# Altium footprint library Transistor.PcbLib: 86 footprints (part 4 of 6)
Each footprint in its own frame and in the unit in brackets; x right, y up, seen from the top. Pads: shape width x height; smd on the part's side, far side on the other; paste and mask are expansions set on the pad; w line width, h text height; cw(c..) or ccw(c..) is an arc to the next point about the centre after c.
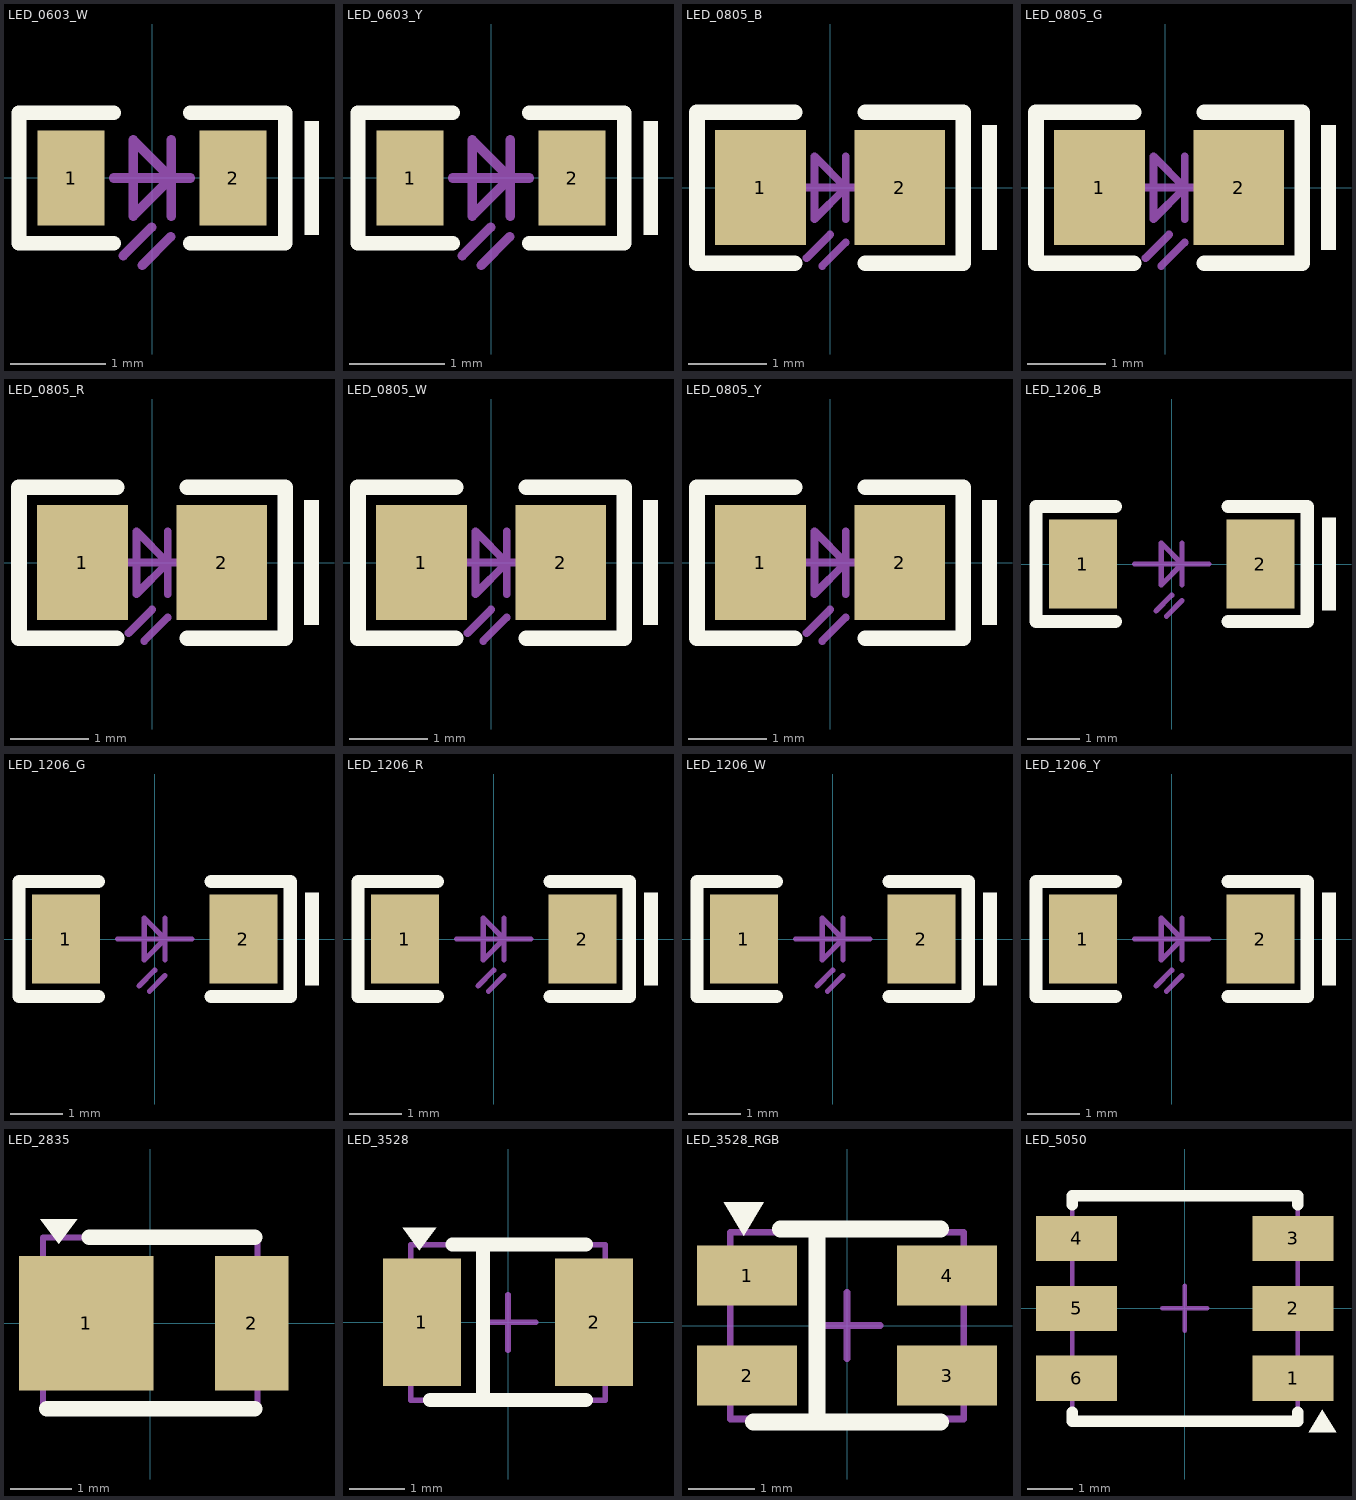
[diagram p3: the footprints below, top view; thin cyan lines are the x and y axes]

## LED_0603_W [mm]
pads (2):
  rect 0.7x1 smd: 1(-0.85,0) 2(0.85,0)
Top Overlay:
  region: 1.753,0.6 1.599,0.6 1.599,-0.6 1.753,-0.6
  lines w0.152: -0.4,-0.686 -1.397,-0.686 -1.397,0.686 -0.4,0.686 ; 0.4,-0.686 1.397,-0.686 1.397,0.686 0.4,0.686
Mechanical 13:
  lines w0.1: -0.4,0 0.4,0 ; -0.305,-0.817 -0.005,-0.517 ; -0.105,-0.917 0.195,-0.617 ; 0.2,-0.4 0.2,0.4 ; -0.2,-0.4 0.2,0 -0.2,0.4 -0.2,-0.4
3D body "15.STEP": height 0.61, standoff 0, extent -0.8,-0.381 0.8,0.421

## LED_0603_Y [mm]
pads (2):
  rect 0.7x1 smd: 1(-0.85,0) 2(0.85,0)
Top Overlay:
  region: 1.753,0.6 1.599,0.6 1.599,-0.6 1.753,-0.6
  lines w0.152: -0.4,-0.686 -1.397,-0.686 -1.397,0.686 -0.4,0.686 ; 0.4,-0.686 1.397,-0.686 1.397,0.686 0.4,0.686
Mechanical 13:
  lines w0.1: -0.4,0 0.4,0 ; -0.305,-0.817 -0.005,-0.517 ; -0.105,-0.917 0.195,-0.617 ; 0.2,-0.4 0.2,0.4 ; -0.2,-0.4 -0.2,0.4 0.2,0 -0.2,-0.4
3D body "14.STEP": height 0.61, standoff 0, extent -0.8,-0.402 0.8,0.406

## LED_0805_B [mm]
pads (2):
  rect 1.16x1.47 smd: 1(-0.89,0) 2(0.89,0)
Top Overlay:
  region: 2.134,0.8 1.945,0.8 1.945,-0.8 2.134,-0.8
  lines w0.2: -0.45,-0.965 -1.702,-0.965 -1.702,0.965 -0.45,0.965 ; 0.45,-0.965 1.702,-0.965 1.702,0.965 0.45,0.965
Mechanical 13:
  lines w0.1: -0.4,0 0.4,0 ; -0.3,-0.9 0,-0.6 ; -0.1,-1 0.2,-0.7 ; 0.2,-0.4 0.2,0.4 ; -0.2,-0.4 -0.2,0.4 0.2,0 -0.2,-0.4
3D body "13.STEP": height 0.8, standoff 0, extent -1.016,-0.626 0.984,0.626

## LED_0805_G [mm]
pads (2):
  rect 1.16x1.47 smd: 1(-0.839,0) 2(0.941,0)
Top Overlay:
  region: 2.184,0.8 1.996,0.8 1.996,-0.8 2.184,-0.8
  lines w0.2: -0.399,-0.965 -1.651,-0.965 -1.651,0.965 -0.399,0.965 ; 0.501,-0.965 1.753,-0.965 1.753,0.965 0.501,0.965
Mechanical 13:
  lines w0.1: -0.349,0 0.451,0 ; -0.249,-0.9 0.051,-0.6 ; -0.049,-1 0.251,-0.7 ; 0.251,-0.4 0.251,0.4 ; -0.149,-0.4 0.251,0 -0.149,0.4 -0.149,-0.4
3D body "12.STEP": height 0.8, standoff 0, extent -0.949,-0.617 1.051,0.635

## LED_0805_R [mm]
pads (2):
  rect 1.16x1.47 smd: 1(-0.89,0) 2(0.89,0)
Top Overlay:
  region: 2.134,0.8 1.945,0.8 1.945,-0.8 2.134,-0.8
  lines w0.2: -0.45,-0.965 -1.702,-0.965 -1.702,0.965 -0.45,0.965 ; 0.45,-0.965 1.702,-0.965 1.702,0.965 0.45,0.965
Mechanical 13:
  lines w0.1: -0.4,0 0.4,0 ; -0.3,-0.9 0,-0.6 ; -0.1,-1 0.2,-0.7 ; 0.2,-0.4 0.2,0.4 ; -0.2,-0.4 -0.2,0.4 0.2,0 -0.2,-0.4
3D body "11.STEP": height 0.8, standoff 0, extent -1,-0.617 1,0.635

## LED_0805_W [mm]
pads (2):
  rect 1.16x1.47 smd: 1(-0.89,0) 2(0.89,0)
Top Overlay:
  region: 2.134,0.8 1.945,0.8 1.945,-0.8 2.134,-0.8
  lines w0.2: -0.45,-0.965 -1.702,-0.965 -1.702,0.965 -0.45,0.965 ; 0.45,-0.965 1.702,-0.965 1.702,0.965 0.45,0.965
Mechanical 13:
  lines w0.1: -0.4,0 0.4,0 ; -0.3,-0.9 0,-0.6 ; -0.1,-1 0.2,-0.7 ; 0.2,-0.4 0.2,0.4 ; -0.2,-0.4 -0.2,0.4 0.2,0 -0.2,-0.4
3D body "10.STEP": height 0.8, standoff 0, extent -1,-0.626 1,0.626

## LED_0805_Y [mm]
pads (2):
  rect 1.16x1.47 smd: 1(-0.89,0) 2(0.89,0)
Top Overlay:
  region: 2.134,0.8 1.945,0.8 1.945,-0.8 2.134,-0.8
  lines w0.2: -0.45,-0.965 -1.702,-0.965 -1.702,0.965 -0.45,0.965 ; 0.45,-0.965 1.702,-0.965 1.702,0.965 0.45,0.965
Mechanical 13:
  lines w0.1: -0.4,0 0.4,0 ; -0.3,-0.9 0,-0.6 ; -0.1,-1 0.2,-0.7 ; 0.2,-0.4 0.2,0.4 ; -0.2,-0.4 0.2,0 -0.2,0.4 -0.2,-0.4
3D body "m.STEP": height 0.8, standoff 0, extent -1,-0.664 1,0.589

## LED_1206_B [mm]
pads (2):
  rect 1.3x1.7 smd: 1(-1.7,0) 2(1.7,0)
Top Overlay:
  region: 3.15,0.889 2.885,0.889 2.885,-0.889 3.15,-0.889
  lines w0.254: -1.079,-1.1 -2.6,-1.1 -2.6,1.1 -1.079,1.1 ; 1.079,-1.1 2.6,-1.1 2.6,1.1 1.079,1.1
Mechanical 13:
  lines w0.1: -0.711,0 0.711,0 ; -0.3,-0.9 0,-0.6 ; -0.1,-1 0.2,-0.7 ; 0.2,-0.4 0.2,0.4 ; -0.2,-0.4 0.2,0 -0.2,0.4 -0.2,-0.4
3D body "8.STEP": height 1, standoff 0, extent -1.601,-0.787 1.601,0.815

## LED_1206_G [mm]
pads (2):
  rect 1.3x1.7 smd: 1(-1.7,0) 2(1.7,0)
Top Overlay:
  region: 3.15,0.889 2.885,0.889 2.885,-0.889 3.15,-0.889
  lines w0.254: -1.079,-1.1 -2.6,-1.1 -2.6,1.1 -1.079,1.1 ; 1.079,-1.1 2.6,-1.1 2.6,1.1 1.079,1.1
Mechanical 13:
  lines w0.1: -0.711,0 0.711,0 ; -0.3,-0.9 0,-0.6 ; -0.1,-1 0.2,-0.7 ; 0.2,-0.4 0.2,0.4 ; -0.2,-0.4 -0.2,0.4 0.2,0 -0.2,-0.4
3D body "7.STEP": height 1, standoff 0, extent -1.626,-0.787 1.576,0.815

## LED_1206_R [mm]
pads (2):
  rect 1.3x1.7 smd: 1(-1.7,0) 2(1.7,0)
Top Overlay:
  region: 3.15,0.889 2.885,0.889 2.885,-0.889 3.15,-0.889
  lines w0.254: -1.079,-1.1 -2.6,-1.1 -2.6,1.1 -1.079,1.1 ; 1.079,-1.1 2.6,-1.1 2.6,1.1 1.079,1.1
Mechanical 13:
  lines w0.1: -0.711,0 0.711,0 ; -0.3,-0.9 0,-0.6 ; -0.1,-1 0.2,-0.7 ; 0.2,-0.4 0.2,0.4 ; -0.2,-0.4 0.2,0 -0.2,0.4 -0.2,-0.4
3D body "6.STEP": height 1, standoff 0, extent -1.601,-0.801 1.601,0.801

## LED_1206_W [mm]
pads (2):
  rect 1.3x1.7 smd: 1(-1.7,0) 2(1.7,0)
Top Overlay:
  region: 3.15,0.889 2.885,0.889 2.885,-0.889 3.15,-0.889
  lines w0.254: -1.079,-1.1 -2.6,-1.1 -2.6,1.1 -1.079,1.1 ; 1.079,-1.1 2.6,-1.1 2.6,1.1 1.079,1.1
Mechanical 13:
  lines w0.1: -0.711,0 0.711,0 ; -0.3,-0.9 0,-0.6 ; -0.1,-1 0.2,-0.7 ; 0.2,-0.4 0.2,0.4 ; -0.2,-0.4 -0.2,0.4 0.2,0 -0.2,-0.4
3D body "5.STEP": height 1, standoff 0, extent -1.601,-0.789 1.601,0.813

## LED_1206_Y [mm]
pads (2):
  rect 1.3x1.7 smd: 1(-1.7,0) 2(1.7,0)
Top Overlay:
  region: 3.15,0.889 2.885,0.889 2.885,-0.889 3.15,-0.889
  lines w0.254: -1.079,-1.1 -2.6,-1.1 -2.6,1.1 -1.079,1.1 ; 1.079,-1.1 2.6,-1.1 2.6,1.1 1.079,1.1
Mechanical 13:
  lines w0.1: -0.711,0 0.711,0 ; -0.3,-0.9 0,-0.6 ; -0.1,-1 0.2,-0.7 ; 0.2,-0.4 0.2,0.4 ; -0.2,-0.4 -0.2,0.4 0.2,0 -0.2,-0.4
3D body "4.STEP": height 1, standoff 0, extent -1.576,-0.789 1.626,0.813

## LED_2835 [mm]
pads (2):
  rect 2.2x2.2 smd: 1(-1.044,0)
  rect 1.2x2.2 smd: 2(1.656,0)
Top Overlay:
  region: -1.794,1.7 -1.194,1.7 -1.494,1.3
  lines w0.254: -1.694,-1.4 1.706,-1.4 ; -0.994,1.4 1.706,1.4
Mechanical 15:
  lines w0.1: -1.75,-1.4 1.75,-1.4 1.75,1.4 -1.75,1.4 -1.75,-1.4
3D body "LED 2835.step": height 0.72, standoff 0, extent -1.756,-1.4 1.756,1.4

## LED_3528 [mm]
pads (2):
  rect 1.4x2.3 smd: 1(-1.55,0) 2(1.55,0)
Top Overlay:
  region: -1.894,1.7 -1.294,1.7 -1.594,1.3
  lines w0.254: -1.4,-1.4 1.4,-1.4 ; -1,1.4 1.4,1.4 ; -0.45,-1.4 -0.45,1.4
Mechanical 15:
  lines w0.1: -0.5,0 0.5,0 ; 0,-0.5 0,0.5 ; -1.75,-1.4 1.75,-1.4 1.75,1.4 -1.75,1.4 -1.75,-1.4
3D body "TR8.STEP": height 1.86, standoff 0, extent -1.75,-1.4 1.75,1.4

## LED_3528_RGB [mm]
pads (4):
  rect 1.5x0.9 smd: 1(-1.5,0.75) 2(-1.5,-0.75) 3(1.5,-0.75) 4(1.5,0.75)
Top Overlay:
  region: -1.85,1.85 -1.25,1.85 -1.55,1.35
  lines w0.254: -1.4,-1.447 1.4,-1.447 ; -1,1.453 1.4,1.453 ; -0.45,-1.447 -0.45,1.453
Mechanical 15:
  lines w0.1: -0.5,0.003 0.5,0.003 ; 0,-0.497 0,0.503 ; -1.75,-1.4 -1.75,1.4 1.75,1.4 1.75,-1.4 -1.75,-1.4
3D body "LED-3528 RGB.step": height 1.9, standoff 0, extent -1.75,-1.4 1.75,1.4

## LED_5050 [mm]
pads (6):
  rect 1.8x1 smd: 1(2.4,-1.55) 2(2.4,0) 3(2.4,1.55) 4(-2.4,1.55) 5(-2.4,0) 6(-2.4,-1.55)
Top Overlay:
  region: 2.75,-2.75 3.35,-2.75 3.05,-2.25
  lines w0.254: -2.5,-2.3 -2.5,-2.5 2.5,-2.5 2.5,-2.3 ; -2.5,2.3 -2.5,2.5 2.5,2.5 2.5,2.3
Mechanical 15:
  lines w0.1: -0.5,0 0.5,0 ; 0,-0.5 0,0.5 ; -2.5,-2.5 2.5,-2.5 2.5,2.5 -2.5,2.5 -2.5,-2.5
3D body "LED_5050.STEP": height 1.6, standoff 0, extent -2.65,-2.5 2.65,2.5